# Altium footprint library Molex FFC - FPC Connectors (SMT).PcbLib: 638 footprints (part 39 of 40)
Each footprint in its own frame and in the unit in brackets; x right, y up, seen from the top. Pads: shape width x height; smd on the part's side, far side on the other; paste and mask are expansions set on the pad; w line width, h text height; cw(c..) or ccw(c..) is an arc to the next point about the centre after c.
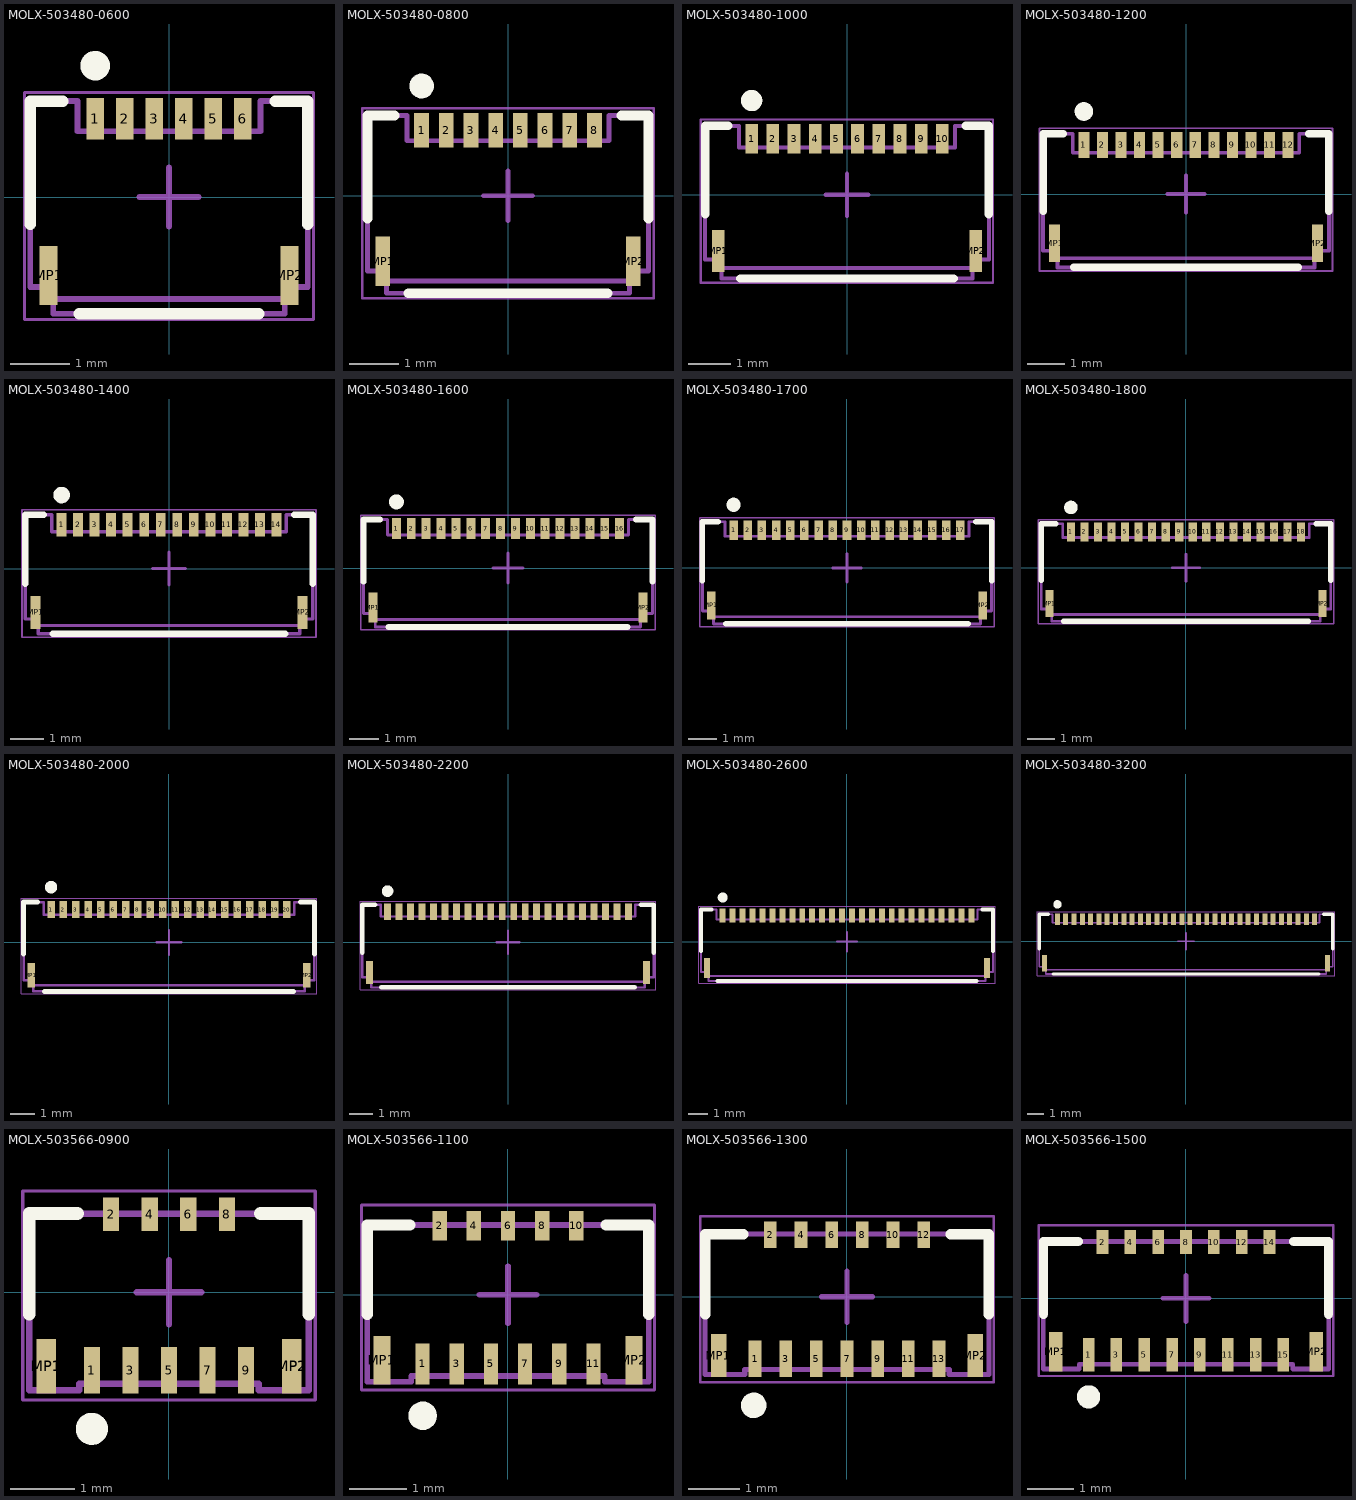
[diagram p38: the footprints below, top view; thin cyan lines are the x and y axes]

## MOLX-503480-0600 [mm] "FPC Connector, 6-Leads, Right Angle, Pitch 0.5 mm, Mated Height 1.0 mm, SMT"
height 1.907
pads (8):
  rect 0.3x0.7 smd: 1(-1.25,1.325) 2(-0.75,1.325) 3(-0.25,1.325) 4(0.25,1.325) 5(0.75,1.325) 6(1.25,1.325)
  rect 0.3x1 smd: MP1(-2.04,-1.325) MP2(2.04,-1.325)
Top Overlay:
  circle w0.25: c-1.25,2.225 r0.125
  lines w0.2: -2.35,-0.458 -2.35,1.625 -1.8,1.625 ; -1.519,-1.975 1.519,-1.975 ; 1.8,1.625 2.35,1.625 2.35,-0.458
Mechanical 13:
  lines w0.1: -1.96,-1.725 1.96,-1.725 ; -2.35,-1.525 -1.96,-1.525 -1.96,-1.975 1.96,-1.975 1.96,-1.525 2.35,-1.525 2.35,1.625 1.55,1.625 1.55,1.115 -1.55,1.115 -1.55,1.625 -2.35,1.625 -2.35,-1.525
Mechanical 15:
  lines w0.05: -2.45,-2.075 -2.45,1.775 2.45,1.775 2.45,-2.075 -2.45,-2.075
  lines w0.1: -0.5,0 0.5,0 ; 0,-0.5 0,0.5
3D body: height 0.25, standoff 0, extent -2.35,-1.975 2.35,1.625

## MOLX-503480-0800 [mm] "FPC Connector, 8-Leads, Right Angle, Pitch 0.5 mm, Mated Height 1.0 mm, SMT"
height 1.907
pads (10):
  rect 0.3x0.7 smd: 1(-1.75,1.325) 2(-1.25,1.325) 3(-0.75,1.325) 4(-0.25,1.325) 5(0.25,1.325) 6(0.75,1.325) 7(1.25,1.325) 8(1.75,1.325)
  rect 0.3x1 smd: MP1(-2.54,-1.325) MP2(2.54,-1.325)
Top Overlay:
  circle w0.25: c-1.75,2.225 r0.125
  lines w0.2: -2.85,-0.458 -2.85,1.625 -2.3,1.625 ; -2.019,-1.975 2.019,-1.975 ; 2.3,1.625 2.85,1.625 ; 2.85,-0.458 2.85,1.625
Mechanical 13:
  lines w0.1: -2.46,-1.725 2.46,-1.725 ; -2.05,1.625 -2.05,1.115 2.05,1.115 2.05,1.625 2.85,1.625 2.85,-1.525 2.46,-1.525 2.46,-1.975 -2.46,-1.975 -2.46,-1.525 -2.85,-1.525 -2.85,1.625 -2.05,1.625
Mechanical 15:
  lines w0.05: -2.95,-2.075 2.95,-2.075 2.95,1.775 -2.95,1.775 -2.95,-2.075
  lines w0.1: -0.5,0 0.5,0 ; 0,-0.5 0,0.5
3D body: height 0.25, standoff 0, extent -2.85,-1.975 2.85,1.625

## MOLX-503480-1000 [mm] "FPC Connector, 10-Leads, Right Angle, Pitch 0.5 mm, Mated Height 1.0 mm, SMT"
height 1.907
pads (12):
  rect 0.3x0.7 smd: 1(-2.25,1.325) 2(-1.75,1.325) 3(-1.25,1.325) 4(-0.75,1.325) 5(-0.25,1.325) 6(0.25,1.325) 7(0.75,1.325) 8(1.25,1.325) 9(1.75,1.325) 10(2.25,1.325)
  rect 0.3x1 smd: MP1(-3.04,-1.325) MP2(3.04,-1.325)
Top Overlay:
  circle w0.25: c-2.25,2.225 r0.125
  lines w0.2: -3.35,-0.458 -3.35,1.625 -2.8,1.625 ; -2.519,-1.975 2.519,-1.975 ; 2.8,1.625 3.35,1.625 ; 3.35,-0.458 3.35,1.625
Mechanical 13:
  lines w0.1: -3.35,1.625 -3.35,-1.525 -2.96,-1.525 -2.96,-1.975 2.96,-1.975 2.96,-1.525 3.35,-1.525 3.35,1.625 2.55,1.625 ; -3.35,1.625 -2.55,1.625 -2.55,1.115 2.55,1.115 2.55,1.624 ; -2.96,-1.725 2.96,-1.725
Mechanical 15:
  lines w0.05: -3.45,-2.075 -3.45,1.775 3.45,1.775 3.45,-2.075 -3.45,-2.075
  lines w0.1: -0.5,0 0.5,0 ; 0,-0.5 0,0.5
3D body: height 0.25, standoff 0, extent -3.35,-1.975 3.35,1.625

## MOLX-503480-1200 [mm] "FPC Connector, 12-Leads, Right Angle, Pitch 0.5 mm, Mated Height 1.0 mm, SMT"
height 1.907
pads (14):
  rect 0.3x0.7 smd: 1(-2.75,1.325) 2(-2.25,1.325) 3(-1.75,1.325) 4(-1.25,1.325) 5(-0.75,1.325) 6(-0.25,1.325) 7(0.25,1.325) 8(0.75,1.325) 9(1.25,1.325) 10(1.75,1.325) 11(2.25,1.325) 12(2.75,1.325)
  rect 0.3x1 smd: MP1(-3.54,-1.325) MP2(3.54,-1.325)
Top Overlay:
  circle w0.25: c-2.75,2.225 r0.125
  lines w0.2: -3.85,-0.458 -3.85,1.625 ; -3.85,1.625 -3.3,1.625 ; -3.019,-1.975 3.019,-1.975 ; 3.3,1.625 3.85,1.625 3.85,-0.458
Mechanical 13:
  lines w0.1: -3.46,-1.725 3.46,-1.725 ; -3.85,-1.525 -3.85,1.625 -3.05,1.625 -3.05,1.115 3.05,1.115 3.05,1.625 3.85,1.625 3.85,-1.525 3.46,-1.525 3.46,-1.975 -3.46,-1.975 -3.46,-1.525 -3.85,-1.525
Mechanical 15:
  lines w0.05: -3.95,-2.075 3.95,-2.075 3.95,1.775 -3.95,1.775 -3.95,-2.075
  lines w0.1: -0.5,0 0.5,0 ; 0,-0.5 0,0.5
3D body: height 0.25, standoff 0, extent -3.85,-1.975 3.85,1.625

## MOLX-503480-1400 [mm] "FPC Connector, 14-Leads, Right Angle, Pitch 0.5 mm, Mated Height 1.0 mm, SMT"
height 1.907
pads (16):
  rect 0.3x0.7 smd: 1(-3.25,1.325) 2(-2.75,1.325) 3(-2.25,1.325) 4(-1.75,1.325) 5(-1.25,1.325) 6(-0.75,1.325) 7(-0.25,1.325) 8(0.25,1.325) 9(0.75,1.325) 10(1.25,1.325) 11(1.75,1.325) 12(2.25,1.325) 13(2.75,1.325) 14(3.25,1.325)
  rect 0.3x1 smd: MP1(-4.04,-1.325) MP2(4.04,-1.325)
Top Overlay:
  circle w0.25: c-3.25,2.225 r0.125
  lines w0.2: -4.35,-0.458 -4.35,1.625 -3.8,1.625 ; -3.519,-1.975 3.519,-1.975 ; 3.8,1.625 4.35,1.625 4.35,-0.458
Mechanical 13:
  lines w0.1: -3.95,-1.725 3.96,-1.725 ; -3.55,1.625 -4.35,1.625 -4.35,-1.525 -3.96,-1.525 -3.96,-1.975 3.96,-1.975 3.96,-1.525 4.35,-1.525 4.35,1.625 3.55,1.625 3.55,1.115 -3.55,1.115 -3.55,1.625
Mechanical 15:
  lines w0.05: -4.45,-2.075 -4.45,1.775 4.45,1.775 4.45,-2.075 -4.45,-2.075
  lines w0.1: -0.5,0 0.5,0 ; 0,-0.5 0,0.5
3D body: height 0.25, standoff 0, extent -4.35,-1.975 4.35,1.625

## MOLX-503480-1600 [mm] "FPC Connector, 16-Leads, Right Angle, Pitch 0.5 mm, Mated Height 1.0 mm, SMT"
height 1.907
pads (18):
  rect 0.3x0.7 smd: 1(-3.75,1.325) 2(-3.25,1.325) 3(-2.75,1.325) 4(-2.25,1.325) 5(-1.75,1.325) 6(-1.25,1.325) 7(-0.75,1.325) 8(-0.25,1.325) 9(0.25,1.325) 10(0.75,1.325) 11(1.25,1.325) 12(1.75,1.325) 13(2.25,1.325) 14(2.75,1.325) 15(3.25,1.325) 16(3.75,1.325)
  rect 0.3x1 smd: MP1(-4.54,-1.325) MP2(4.54,-1.325)
Top Overlay:
  circle w0.25: c-3.75,2.225 r0.125
  lines w0.2: -4.85,-0.458 -4.85,1.625 -4.3,1.625 ; -4.019,-1.975 4.019,-1.975 ; 4.3,1.625 4.849,1.625 4.849,-0.458
Mechanical 13:
  lines w0.1: -4.46,-1.725 4.46,-1.725 ; -4.85,-1.525 -4.46,-1.525 -4.46,-1.975 4.46,-1.975 4.46,-1.525 4.85,-1.525 4.85,1.625 4.05,1.625 4.05,1.115 -4.05,1.115 -4.05,1.625 -4.85,1.625 -4.85,-1.525
Mechanical 15:
  lines w0.05: 4.95,-2.075 4.95,1.775 ; 4.95,-2.075 -4.95,-2.075 -4.95,1.775 4.95,1.775
  lines w0.1: -0.5,0 0.5,0 ; 0,-0.5 0,0.5
3D body: height 0.25, standoff 0, extent -4.85,-1.975 4.85,1.625

## MOLX-503480-1700 [mm] "FPC Connector, 17-Leads, Right Angle, Pitch 0.5 mm, Mated Height 1.0 mm, SMT"
height 1.907
pads (19):
  rect 0.3x0.7 smd: 1(-4,1.325) 2(-3.5,1.325) 3(-3,1.325) 4(-2.5,1.325) 5(-2,1.325) 6(-1.5,1.325) 7(-1,1.325) 8(-0.5,1.325) 9(0,1.325) 10(0.5,1.325) 11(1,1.325) 12(1.5,1.325) 13(2,1.325) 14(2.5,1.325) 15(3,1.325) 16(3.5,1.325) 17(4,1.325)
  rect 0.3x1 smd: MP1(-4.79,-1.325) MP2(4.79,-1.325)
Top Overlay:
  circle w0.25: c-4,2.225 r0.125
  lines w0.2: -5.1,-0.458 -5.1,1.625 -4.55,1.625 ; -4.269,-1.975 4.269,-1.975 ; 4.55,1.625 5.1,1.625 5.1,-0.458
Mechanical 13:
  lines w0.1: -4.71,-1.725 4.71,-1.725 ; 4.3,1.625 4.3,1.625 ; 4.3,1.625 5.1,1.625 5.1,-1.525 4.71,-1.525 4.71,-1.975 -4.71,-1.975 -4.71,-1.525 -5.1,-1.525 -5.1,1.625 -4.3,1.625 -4.3,1.115 4.3,1.115 4.3,1.625
Mechanical 15:
  lines w0.05: -5.2,-2.075 -5.2,1.775 5.2,1.775 5.2,-2.075 ; -5.2,-2.075 5.2,-2.075
  lines w0.1: -0.5,0 0.5,0 ; 0,-0.5 0,0.5
3D body: height 0.25, standoff 0, extent -5.1,-1.975 5.1,1.625

## MOLX-503480-1800 [mm] "FPC Connector, 18-Leads, Right Angle, Pitch 0.5 mm, Mated Height 1.0 mm, SMT"
height 1.907
pads (20):
  rect 0.3x0.7 smd: 1(-4.25,1.325) 2(-3.75,1.325) 3(-3.25,1.325) 4(-2.75,1.325) 5(-2.25,1.325) 6(-1.75,1.325) 7(-1.25,1.325) 8(-0.75,1.325) 9(-0.25,1.325) 10(0.25,1.325) 11(0.75,1.325) 12(1.25,1.325) 13(1.75,1.325) 14(2.25,1.325) 15(2.75,1.325) 16(3.25,1.325) 17(3.75,1.325) 18(4.25,1.325)
  rect 0.3x1 smd: MP1(-5.04,-1.325) MP2(5.04,-1.325)
Top Overlay:
  circle w0.25: c-4.25,2.225 r0.125
  lines w0.2: -5.35,-0.459 -5.35,1.625 ; -5.35,1.625 -4.8,1.625 ; -4.519,-1.975 4.519,-1.975 ; 4.8,1.625 5.35,1.625 5.35,-0.458
Mechanical 13:
  lines w0.1: -4.96,-1.725 4.96,-1.725 ; 5.35,1.625 4.55,1.625 4.55,1.115 -4.55,1.115 -4.55,1.625 -5.35,1.625 -5.35,-1.525 -4.96,-1.525 -4.96,-1.975 4.96,-1.975 4.96,-1.525 5.35,-1.525 5.35,-1.525 5.35,1.625
Mechanical 15:
  lines w0.05: -5.45,-2.075 5.45,-2.075 5.45,1.775 -5.45,1.775 -5.45,-2.075
  lines w0.1: -0.5,0 0.5,0 ; 0,-0.5 0,0.5
3D body: height 0.25, standoff 0, extent -5.35,-1.975 5.35,1.625

## MOLX-503480-2000 [mm] "FPC Connector, 20-Leads, Right Angle, Pitch 0.5 mm, Mated Height 1.0 mm, SMT"
height 1.907
pads (22):
  rect 0.3x0.7 smd: 1(-4.75,1.325) 2(-4.25,1.325) 3(-3.75,1.325) 4(-3.25,1.325) 5(-2.75,1.325) 6(-2.25,1.325) 7(-1.75,1.325) 8(-1.25,1.325) 9(-0.75,1.325) 10(-0.25,1.325) 11(0.25,1.325) 12(0.75,1.325) 13(1.25,1.325) 14(1.75,1.325) 15(2.25,1.325) 16(2.75,1.325) 17(3.25,1.325) 18(3.75,1.325) 19(4.25,1.325) 20(4.75,1.325)
  rect 0.3x1 smd: MP1(-5.54,-1.325) MP2(5.54,-1.325)
Top Overlay:
  circle w0.25: c-4.75,2.225 r0.125
  lines w0.2: -5.85,-0.458 -5.85,1.625 -5.3,1.625 ; -5.019,-1.975 5.019,-1.975 ; 5.3,1.625 5.85,1.625 5.85,-0.458
Mechanical 13:
  lines w0.1: -5.46,-1.725 5.46,-1.725 ; -5.85,-1.525 -5.46,-1.525 -5.46,-1.975 5.46,-1.975 5.46,-1.525 5.85,-1.525 5.85,1.625 5.05,1.625 5.05,1.115 -5.05,1.115 -5.05,1.625 -5.85,1.625 -5.85,-1.525
Mechanical 15:
  lines w0.05: -5.95,-2.075 -5.95,1.775 5.95,1.775 5.95,-2.075 -5.95,-2.075
  lines w0.1: -0.5,0 0.5,0 ; 0,-0.5 0,0.5
3D body: height 0.25, standoff 0, extent -5.85,-1.975 5.85,1.625

## MOLX-503480-2200 [mm] "FPC Connector, 22-Leads, Right Angle, Pitch 0.5 mm, Mated Height 1.0 mm, SMT"
height 1.907
pads (24):
  rect 0.3x0.7 smd: 1(-5.25,1.325) 2(-4.75,1.325) 3(-4.25,1.325) 4(-3.75,1.325) 5(-3.25,1.325) 6(-2.75,1.325) 7(-2.25,1.325) 8(-1.75,1.325) 9(-1.25,1.325) 10(-0.75,1.325) 11(-0.25,1.325) 12(0.25,1.325) 13(0.75,1.325) 14(1.25,1.325) 15(1.75,1.325) 16(2.25,1.325) 17(2.75,1.325) 18(3.25,1.325) 19(3.75,1.325) 20(4.25,1.325) 21(4.75,1.325) 22(5.25,1.325)
  rect 0.3x1 smd: MP1(-6.04,-1.325) MP2(6.04,-1.325)
Top Overlay:
  circle w0.25: c-5.25,2.225 r0.125
  lines w0.2: -6.35,-0.459 -6.35,1.625 ; -6.35,1.625 -5.8,1.625 ; -5.519,-1.975 5.519,-1.975 ; 5.8,1.625 6.35,1.625 ; 6.35,-0.458 6.35,1.625
Mechanical 13:
  lines w0.1: -6.35,1.625 -5.55,1.625 -5.55,1.115 5.55,1.115 5.55,1.625 6.35,1.625 ; -6.35,1.625 -6.35,-1.525 -5.96,-1.525 -5.96,-1.975 5.96,-1.975 5.96,-1.525 6.35,-1.525 6.35,1.625 ; -5.96,-1.725 5.96,-1.725
Mechanical 15:
  lines w0.05: -6.45,-2.075 -6.45,1.775 6.45,1.775 6.45,-2.075 -6.45,-2.075
  lines w0.1: -0.5,0 0.5,0 ; 0,-0.5 0,0.5
3D body: height 0.25, standoff 0, extent -6.35,-1.975 6.35,1.625

## MOLX-503480-2600 [mm] "FPC Connector, 26-Leads, Right Angle, Pitch 0.5 mm, Mated Height 1.0 mm, SMT"
height 1.907
pads (28):
  rect 0.3x0.7 smd: 1(-6.25,1.325) 2(-5.75,1.325) 3(-5.25,1.325) 4(-4.75,1.325) 5(-4.25,1.325) 6(-3.75,1.325) 7(-3.25,1.325) 8(-2.75,1.325) 9(-2.25,1.325) 10(-1.75,1.325) 11(-1.25,1.325) 12(-0.75,1.325) 13(-0.25,1.325) 14(0.25,1.325) 15(0.75,1.325) 16(1.25,1.325) 17(1.75,1.325) 18(2.25,1.325) 19(2.75,1.325) 20(3.25,1.325) 21(3.75,1.325) 22(4.25,1.325) 23(4.75,1.325) 24(5.25,1.325) 25(5.75,1.325) 26(6.25,1.325)
  rect 0.3x1 smd: MP1(-7.04,-1.325) MP2(7.04,-1.325)
Top Overlay:
  circle w0.25: c-6.25,2.225 r0.125
  lines w0.2: -7.35,-0.458 -7.35,1.625 -6.8,1.625 ; -6.519,-1.975 6.519,-1.975 ; 6.8,1.625 7.35,1.625 ; 7.35,-0.458 7.35,1.625
Mechanical 13:
  lines w0.1: -6.96,-1.525 -7.35,-1.525 -7.35,1.625 -6.55,1.625 ; -6.96,-1.725 6.96,-1.725 ; -6.96,-1.525 -6.96,-1.975 6.96,-1.975 6.96,-1.525 7.35,-1.525 ; -6.55,1.625 -6.55,1.115 6.55,1.115 6.55,1.625 7.35,1.625 ; 7.35,-1.525 7.35,1.625
Mechanical 15:
  lines w0.05: -7.45,-2.075 7.45,-2.075 7.45,1.775 -7.45,1.775 -7.45,-2.075
  lines w0.1: -0.5,0 0.5,0 ; 0,-0.5 0,0.5
3D body: height 0.25, standoff 0, extent -7.35,-1.975 7.35,1.625

## MOLX-503480-3200 [mm] "FPC Connector, 32-Leads, Right Angle, Pitch 0.5 mm, Mated Height 1.0 mm, SMT"
height 1.907
pads (34):
  rect 0.3x0.7 smd: 1(-7.75,1.325) 2(-7.25,1.325) 3(-6.75,1.325) 4(-6.25,1.325) 5(-5.75,1.325) 6(-5.25,1.325) 7(-4.75,1.325) 8(-4.25,1.325) 9(-3.75,1.325) 10(-3.25,1.325) 11(-2.75,1.325) 12(-2.25,1.325) 13(-1.75,1.325) 14(-1.25,1.325) 15(-0.75,1.325) 16(-0.25,1.325) 17(0.25,1.325) 18(0.75,1.325) 19(1.25,1.325) 20(1.75,1.325) 21(2.25,1.325) 22(2.75,1.325) 23(3.25,1.325) 24(3.75,1.325) 25(4.25,1.325) 26(4.75,1.325) 27(5.25,1.325) 28(5.75,1.325) 29(6.25,1.325) 30(6.75,1.325) 31(7.25,1.325) 32(7.75,1.325)
  rect 0.3x1 smd: MP1(-8.54,-1.325) MP2(8.54,-1.325)
Top Overlay:
  circle w0.25: c-7.75,2.225 r0.125
  lines w0.2: -8.85,-0.459 -8.85,1.625 -8.3,1.625 ; -8.019,-1.975 8.019,-1.975 ; 8.3,1.625 8.85,1.625 8.85,-0.458
Mechanical 13:
  lines w0.1: -8.46,-1.725 8.46,-1.725 ; -8.85,-1.525 -8.85,1.625 -8.05,1.625 -8.05,1.115 8.05,1.115 8.05,1.625 8.85,1.625 8.85,-1.525 8.46,-1.525 8.46,-1.975 -8.46,-1.975 -8.46,-1.525 -8.85,-1.525
Mechanical 15:
  lines w0.05: -8.95,-2.075 8.95,-2.075 8.95,1.775 -8.95,1.775 -8.95,-2.075
  lines w0.1: -0.5,0 0.5,0 ; 0,-0.5 0,0.5
3D body: height 0.25, standoff 0, extent -8.85,-1.975 8.85,1.625

## MOLX-503566-0900 [mm] "FPC Connector, 9-Leads, Right Angle, Pitch 0.3 mm, Mated Height 0.95 mm, SMT"
height 0.95
pads (11):
  rect 0.25x0.72 smd: 1(-1.2,-1.215) 3(-0.6,-1.215) 5(0,-1.215) 7(0.6,-1.215) 9(1.2,-1.215)
  rect 0.25x0.52 smd: 2(-0.9,1.215) 4(-0.3,1.215) 6(0.3,1.215) 8(0.9,1.215)
  rect 0.3x0.85 smd: MP1(-1.91,-1.15) MP2(1.91,-1.15)
Top Overlay:
  circle w0.25: c-1.2,-2.125 r0.125
  lines w0.2: -2.175,-0.342 -2.175,1.225 -1.425,1.225 ; 1.425,1.225 2.175,1.225 2.175,-0.342
Mechanical 13:
  lines w0.1: -2.175,1.225 2.176,1.225 2.175,-1.525 1.4,-1.525 1.4,-1.425 -1.4,-1.425 -1.4,-1.525 -2.175,-1.525 -2.175,1.225
Mechanical 15:
  lines w0.05: -2.275,-1.675 -2.275,1.575 2.275,1.575 2.275,-1.675 -2.275,-1.675
  lines w0.1: -0.5,0 0.5,0 ; 0,-0.5 0,0.5
3D body: height 0.25, standoff 0, extent -2.175,-1.525 2.175,1.325

## MOLX-503566-1100 [mm] "FPC Connector, 11-Leads, Right Angle, Pitch 0.3 mm, Mated Height 0.95 mm, SMT"
height 0.95
pads (13):
  rect 0.25x0.72 smd: 1(-1.5,-1.215) 3(-0.9,-1.215) 5(-0.3,-1.215) 7(0.3,-1.215) 9(0.9,-1.215) 11(1.5,-1.215)
  rect 0.25x0.52 smd: 2(-1.2,1.215) 4(-0.6,1.215) 6(0,1.215) 8(0.6,1.215) 10(1.2,1.215)
  rect 0.3x0.85 smd: MP1(-2.21,-1.15) MP2(2.21,-1.15)
Top Overlay:
  circle w0.25: c-1.5,-2.125 r0.125
  lines w0.2: -2.475,-0.342 -2.475,1.225 -1.725,1.225 ; 1.725,1.225 2.475,1.225 2.475,-0.342
Mechanical 13:
  lines w0.1: -2.475,-1.525 -1.7,-1.525 -1.7,-1.425 1.7,-1.425 1.7,-1.525 2.475,-1.525 2.475,1.225 -2.475,1.225 -2.475,-1.525
Mechanical 15:
  lines w0.05: -2.575,-1.675 2.575,-1.675 2.575,1.575 -2.575,1.575 -2.575,-1.675
  lines w0.1: -0.5,0 0.5,0 ; 0,-0.5 0,0.5
3D body: height 0.25, standoff 0, extent -2.475,-1.524 2.475,1.326

## MOLX-503566-1300 [mm] "FPC Connector, 13-Leads, Right Angle, Pitch 0.3 mm, Mated Height 0.95 mm, SMT"
height 0.95
pads (15):
  rect 0.25x0.72 smd: 1(-1.8,-1.215) 3(-1.2,-1.215) 5(-0.6,-1.215) 7(0,-1.215) 9(0.6,-1.215) 11(1.2,-1.215) 13(1.8,-1.215)
  rect 0.25x0.52 smd: 2(-1.5,1.215) 4(-0.9,1.215) 6(-0.3,1.215) 8(0.3,1.215) 10(0.9,1.215) 12(1.5,1.215)
  rect 0.3x0.85 smd: MP1(-2.51,-1.15) MP2(2.51,-1.15)
Top Overlay:
  circle w0.25: c-1.825,-2.125 r0.125
  lines w0.2: -2.775,-0.342 -2.775,1.225 -2.025,1.225 ; 2.025,1.225 2.775,1.225 2.775,-0.342
Mechanical 13:
  lines w0.1: 2.775,1.225 2.775,-1.525 2,-1.525 2,-1.425 -2,-1.425 -2,-1.525 -2.775,-1.525 -2.775,1.225 2.775,1.225
Mechanical 15:
  lines w0.05: -2.875,-1.675 -2.875,1.575 2.875,1.575 2.875,-1.675 -2.875,-1.675
  lines w0.1: -0.5,0 0.5,0 ; 0,-0.5 0,0.5
3D body: height 0.25, standoff 0, extent -2.775,-1.525 2.775,1.325

## MOLX-503566-1500 [mm] "FPC Connector, 15-Leads, Right Angle, Pitch 0.3 mm, Mated Height 0.95 mm, SMT"
height 0.95
pads (17):
  rect 0.25x0.72 smd: 1(-2.1,-1.215) 3(-1.5,-1.215) 5(-0.9,-1.215) 7(-0.3,-1.215) 9(0.3,-1.215) 11(0.9,-1.215) 13(1.5,-1.215) 15(2.1,-1.215)
  rect 0.25x0.52 smd: 2(-1.8,1.215) 4(-1.2,1.215) 6(-0.6,1.215) 8(0,1.215) 10(0.6,1.215) 12(1.2,1.215) 14(1.8,1.215)
  rect 0.3x0.85 smd: MP1(-2.81,-1.15) MP2(2.81,-1.15)
Top Overlay:
  circle w0.25: c-2.1,-2.125 r0.125
  lines w0.2: -3.075,-0.342 -3.075,1.225 -2.325,1.225 ; 2.325,1.225 3.075,1.225 3.075,-0.342
Mechanical 13:
  lines w0.1: -3.075,-1.525 -2.3,-1.525 -2.3,-1.425 2.3,-1.425 2.3,-1.525 3.075,-1.525 3.075,1.225 -3.075,1.225 -3.075,-1.525 ; -3.075,1.174 -3.075,1.174
Mechanical 15:
  lines w0.05: -3.175,-1.675 -3.175,1.575 3.175,1.575 3.175,-1.675 -3.175,-1.675
  lines w0.1: -0.5,0 0.5,0 ; 0,-0.5 0,0.5
3D body: height 0.25, standoff 0, extent -3.075,-1.525 3.075,1.325